# Altium schematic symbol library Electronic Devices_LIB.SchLib: 703 symbols (part 3 of 8) (continued)
## IC_CMOS_SENSOR_OV10642-N79Y-PF (continued)

## IC_CMOS_SENSOR_OX08B40
designator U?, comment OX08B40
1/1.73" color CMOS 8 MP (3840X2160) hight dynamic range (HDR) high definition (HD) image sensor; Manufacturer: OmniVision Technologies; Supplier 1: Digikey; Manufacturer Part Number: OX08B40; RoHS: No; Supplier Part Number 1: 884-OX08B40-EXAL-AA1B-ND
footprint CMOS_SENSOR_OX08B40_BGA88C90P11X8_1100X800X137 (BGA, 88-Leads, Body 11.00x8.00mmx1.37mm, Pitch 0.90mm)
pins: A1 NC1, A2 DVDD, A3 DVDD, A4 AVDD, A5 AVDD, A6 AVDD, A7 AVDD, A8 AVDD, A9 VH2, A10 DVDD, A11 NC3, B1 DGND, B2 DGND, B3 DGND, B4 AGND, B5 AGND, B6 AGND, B7 AGND, B8 AGND, B9 VH1, B10 DGND, B11 DVDD, C1 MDN2, C2 MDP2, C3 DGND, C4 DVDD, C5 VMERRB, C6 GPIO5, C7 SCL, C8 SDA, C9 TM, C10 DGND, C11 DVDD, D1 MDN0, D2 MDP0, D3 DGND, D4 DVDD, D5 DVDD, D6 GPIO6, D7 GPIO2, D8 SID, D9 RESETB, D10 DGND, D11 DVDD, E1 MCN, E2 MCP, E3 DGND, E6 XVCLK, E7 GPIO1, E8 GPIO4, E9 ATEST, E10 DGND, E11 DVDD, F1 MDN1, F2 MDP1, F3 DGND, F4 DOVDD, F5 VSYNC, F6 ERRB, F7 GPIO0, F8 GPIO3, F9 DOVDD, F10 DGND, F11 DVDD, G1 MDN3, G2 MDP3, G3 DGND, G4 FSIN, G5 AGND, G6 AGND, G8 AGND, G9 AGND, G10 VN2, G11 DVDD, H1 NC2, H2 DGND, H3 DVDD, H4 DVDD, H5 AVDD, H6 AVDD, H7 AVDD, H8 AVDD, H9 AVDD, H10 VN1, H11 NC4

## IC_COMPARATOR_CMOS_1_RS8907XF
designator U?, comment RS8907XF
IC Comp Rrio 1.4V P-p SOT23-5; Manufacturer: RUNIC Technology; Supplier 1: Digikey; Manufacturer Part Number: RS8907XF; RoHS: No; Stock 1: 2177; Pricing 1: 1=0.6, 10=0.511, 25=0.4772, 100=0.3818, 250=0.35452, 500=0.29996, 1000=0.2318 (USD); Supplier Part Number 1: 3565-RS8907XFCT-ND
footprint SOT-23-5
pins: 1 +IN (in), 2 V- (power), 3 -IN (in), 4 OUT (out), 5 V+ (power)

## IC_CURRENT_SENSOR_ACS71240KEXBLT-010B3
designator U?, comment ACS71240KEXBLT-010B3
Closed Loop/Open Loop Current Sensor AC/DC Current 3.3V Automotive 12-Pin QFN EP T/R; Manufacturer: Allegro MicroSystems; Supplier 1: Digi-Key; Manufacturer Part Number: ACS71240KEXBLT-010B3; RoHS: Yes; Category: Current Sensors; Stock 1: 9615; Pricing 1: 1=2.09, 10=1.614, 25=1.3452, 50=1.3154, 100=1.1958, 500=1.04636 (USD); Supplier Part Number 1: 620-2048-1-ND
pins: 1 IP+, 3 IP-, 5 GND, 6 ~{FAULT}, 7 NC_1, 8 NC_2, 9 NC_3, 10 NC_4, 11 VIOUT, 12 VCC

## IC_DAC_10BIT_AD5821ABCBZ-REEL7
designator U?, comment AD5821ABCBZ-REEL7
DAC 1-CH 10-bit 9-Pin WLCSP T/R; Manufacturer: Analog Devices; Max Power Dissipation: 5mW; Number of Channels: 1; Interface: I2C,Serial,2-Wire; Max Supply Voltage: 5.5V; Min Supply Voltage: 2.7V; Number of Bits: 10; Settling Time: 250us; Differential Output: No; Resolution: 10b; Integral Nonlinearity (INL): 4LSB; Sampling Rate: 20KS/s; Output Polarity: Unipolar; Supplier 1: Digikey; Manufacturer Part Number: AD5821ABCBZ-REEL7; RoHS: Yes; Category: Digital to Analog Converters (DACs); Stock 1: 2098; Pricing 1: 1=2.83, 10=2.543, 25=2.3988, 100=2.0437, 250=1.919, 500=1.67912, 1000=1.39128 (USD); Case/Package: 120; Number of Pins: 9; Contact Plating: Copper,Tin,Silver; Min Operating Temperature: -25°C; Max Operating Temperature: 85°C; Package Quantity: 3000; Number of DAC Channels: 1; Packaging: Tape and Reel; Number of D/A Converters: 1; Number of Converters: 1; Power Dissipation: 5mW; Series: -; Lead Free: Contains Lead; RoHS Compliant: Yes; ComponentLink1URL: https://datasheet.ciiva.com/6673/ad5821a-6673472.pdf?src-supplier=Digikey; ComponentLink1Description: https://datasheet.ciiva.com/6673/ad5821a-6673472.pdf?src-supplier=Digikey; ComponentLink2URL: https://datasheet.ciiva.com/6673/ad5821a-6673471.pdf?src-supplier=Digikey; ComponentLink2Description: https://datasheet.ciiva.com/6673/ad5821a-6673471.pdf?src-supplier=Digikey; ComponentLink3URL: https://datasheet.ciiva.com/8192/ad5821a-8192070.pdf?src-supplier=Avnet; ComponentLink3Description: https://datasheet.ciiva.com/8192/ad5821a-8192070.pdf?src-supplier=Avnet; ComponentLink4URL: https://datasheet.ciiva.com/48705/001246786-da-01-en-ic-dac-10b-ad5821abcbz-reel7-wlcsp-9-adi-48705206.pdf?src-supplier=Conrad; ComponentLink4Description: https://datasheet.ciiva.com/48705/001246786-da-01-en-ic-dac-10b-ad5821abcbz-reel7-wlcsp-9-adi-48705206.pdf?src-supplier=Conrad; Supplier Part Number 1: 505-AD5821ABCBZ-REEL7CT-ND
footprint IC_DAC_BGA9C50P3X3_152X169X65
pins: A1 ISINK, A2 NC, A3 XSHUTDOWN, B1 AGND, B2 DGND_1, B3 SDA, C1 DGND_2, C2 VDD, C3 SCL

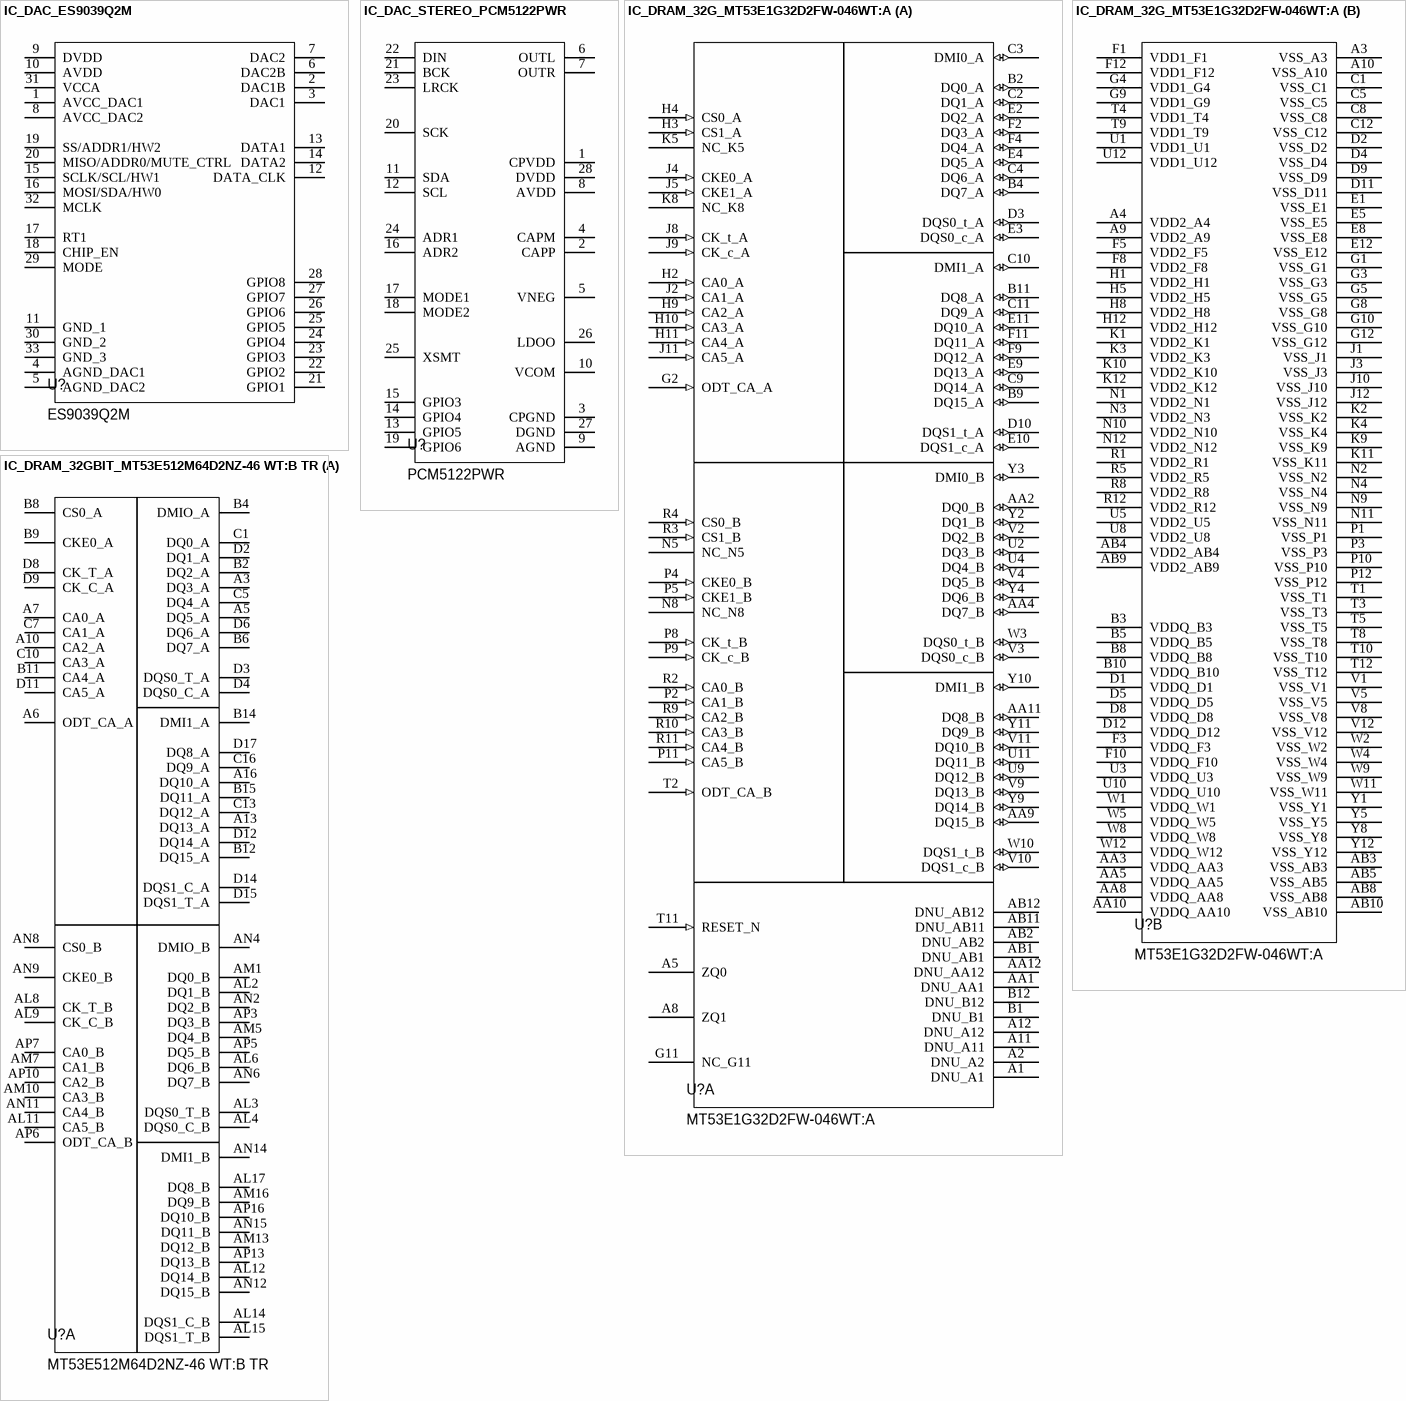
[diagram p9: symbols IC_DAC_ES9039Q2M to IC_DRAM_32GBIT_MT53E512M64D2NZ-46 WT:B TR]

## IC_DAC_ES9039Q2M
designator U?, comment ES9039Q2M
Digital to Analog Converters - DAC Sabre 32 Reference Stereo low power audiophile DAC w/DOP, TDM; Manufacturer: ESS Technology; Supplier 1: Mouser; Manufacturer Part Number: ES9039Q2M; RoHS: No; Category: Uncategorized; Stock 1: 726; Pricing 1: 1=17, 5=14.67, 10=14.67, 25=13.6, 50=13.6, 100=12.75, 1000=12.75, 10000=12.75 (USD); Supplier Part Number 1: 460-ES9039Q2M
footprint IC_DAC_QFN50P500X500X90-33N-D (32 QFN)
pins: 1 AVCC_DAC1, 2 DAC1B, 3 DAC1, 4 AGND_DAC1, 5 AGND_DAC2, 6 DAC2B, 7 DAC2, 8 AVCC_DAC2, 9 DVDD, 10 AVDD, 11 GND_1, 12 DATA_CLK, 13 DATA1, 14 DATA2, 15 SCLK/SCL/HW1, 16 MOSI/SDA/HW0, 17 RT1, 18 CHIP_EN, 19 SS/ADDR1/HW2, 20 MISO/ADDR0/MUTE_CTRL, 21 GPIO1, 22 GPIO2, 23 GPIO3, 24 GPIO4, 25 GPIO5, 26 GPIO6, 27 GPIO7, 28 GPIO8, 29 MODE, 30 GND_2, 31 VCCA, 32 MCLK, 33 GND_3

## IC_DAC_STEREO_PCM5122PWR
designator U?, comment PCM5122PWR
2V RMS DIRECTPATH 112dB Audio Stereo DAC with PCM Interface and Fixed Audio Processing 28-TSSOP -25 to 85; Manufacturer: Texas Instruments; Number of Channels: 2; Operating Supply Voltage: 3.3V; Interface: I2S; Output Voltage: 2.1V; Sampling Rate: 384000S/s; Resolution: 32b; Supply Type: Analog,Digital; Conversion Rate: 384KS/s; Number of Analog Inputs: 0; Output Type: Voltage; Supply Current: 15mA; Supplier 1: Digikey; Manufacturer Part Number: PCM5122PWR; RoHS: Yes; Category: Amplifiers - Audio; Stock 1: 1614; Pricing 1: 1=4.33, 10=3.283, 25=3.0216, 100=2.7335, 250=2.59624, 500=2.51348, 1000=2.44534, 2000=1.39517, 4000=1.36545, 6000=1.35056 (USD); Mount: Surface Mount; Case/Package: TSSOP; Number of Pins: 28; Min Operating Temperature: -25°C; Max Operating Temperature: 85°C; Packaging: Tape and Reel; Package Quantity: 2000; Number of D/A Converters: 2; Signal to Noise Ratio (SNR): 112dB; Number of DAC Channels: 2; Number of Analog Outputs: 2; Series: DirectPath™; Lead Free: Lead Free; RoHS Compliant: Yes; ComponentLink1URL: https://datasheet.ciiva.com/41460/001186187-da-01-en-ic-dac-16-24-32b-pcm5122pwr-tssop-28-tid-41460125.pdf?src-supplier=Conrad; ComponentLink1Description: https://datasheet.ciiva.com/41460/001186187-da-01-en-ic-dac-16-24-32b-pcm5122pwr-tssop-28-tid-41460125.pdf?src-supplier=Conrad; ComponentLink2URL: https://datasheet.ciiva.com/6671/pcm5122-6671229.pdf?src-supplier=Digikey; ComponentLink2Description: https://datasheet.ciiva.com/6671/pcm5122-6671229.pdf?src-supplier=Digikey; ComponentLink3URL: https://datasheet.ciiva.com/6671/pcm5122-6671230.pdf?src-supplier=Digikey; ComponentLink3Description: https://datasheet.ciiva.com/6671/pcm5122-6671230.pdf?src-supplier=Digikey; ComponentLink4URL: https://datasheet.ciiva.com/6671/pcm5122-6671231.pdf?src-supplier=Digikey; ComponentLink4Description: https://datasheet.ciiva.com/6671/pcm5122-6671231.pdf?src-supplier=Digikey; Supplier Part Number 1: 296-35527-1-ND
footprint IC_DAC_SOP65P640X120-28N
pins: 1 CPVDD, 2 CAPP, 3 CPGND, 4 CAPM, 5 VNEG, 6 OUTL, 7 OUTR, 8 AVDD, 9 AGND, 10 VCOM, 11 SDA, 12 SCL, 13 GPIO5, 14 GPIO4, 15 GPIO3, 16 ADR2, 17 MODE1, 18 MODE2, 19 GPIO6, 20 SCK, 21 BCK, 22 DIN, 23 LRCK, 24 ADR1, 25 XSMT, 26 LDOO, 27 DGND, 28 DVDD

## IC_DRAM_32G_MT53E1G32D2FW-046WT:A
designator U?, comment MT53E1G32D2FW-046WT:A
LPDDR4 32G 1GX32 FBGA DDP; Manufacturer: Micron Technology; Supplier 1: Digikey; Manufacturer Part Number: MT53E1G32D2FW-046WT:A; RoHS: No; Stock 1: 1349; Pricing 1: 1=26.73, 10=24.892, 25=24.6252, 50=24.0178, 100=21.0842, 250=20.37296, 500=19.82474 (USD); Supplier Part Number 1: 557-MT53E1G32D2FW-046WT:A-ND
footprint IC_DRAM_BGA200_0P65X0P8_10P1X14P6 (200-TFBGA (10x14.5))
part A pins: A1 DNU_A1, A2 DNU_A2, A5 ZQ0, A8 ZQ1, A11 DNU_A11, A12 DNU_A12, AA1 DNU_AA1, AA2 DQ0_B (io), AA4 DQ7_B (io), AA9 DQ15_B (io), AA11 DQ8_B (io), AA12 DNU_AA12, AB1 DNU_AB1, AB2 DNU_AB2, AB11 DNU_AB11, AB12 DNU_AB12, B1 DNU_B1, B2 DQ0_A (io), B4 DQ7_A (io), B9 DQ15_A (io), B11 DQ8_A (io), B12 DNU_B12, C2 DQ1_A (io), C3 DMI0_A (io), C4 DQ6_A (io), C9 DQ14_A (io), C10 DMI1_A (io), C11 DQ9_A (io), D3 DQS0_t_A (io), D10 DQS1_t_A (io), E2 DQ2_A (io), E3 DQS0_c_A (io), E4 DQ5_A (io), E9 DQ13_A (io), E10 DQS1_c_A (io), E11 DQ10_A (io), F2 DQ3_A (io), F4 DQ4_A (io), F9 DQ12_A (io), F11 DQ11_A (io), G2 ODT_CA_A (in), G11 NC_G11, H2 CA0_A (in), H3 CS1_A (in), H4 CS0_A (in), H9 CA2_A (in), H10 CA3_A (in), H11 CA4_A (in), J2 CA1_A (in), J4 CKE0_A (in), J5 CKE1_A (in), J8 CK_t_A (in), J9 CK_c_A (in), J11 CA5_A (in), K5 NC_K5, K8 NC_K8, N5 NC_N5, N8 NC_N8, P2 CA1_B (in), P4 CKE0_B (in), P5 CKE1_B (in), P8 CK_t_B (in), P9 CK_c_B (in), P11 CA5_B (in), R2 CA0_B (in), R3 CS1_B (in), R4 CS0_B (in), R9 CA2_B (in), R10 CA3_B (in), R11 CA4_B (in), T2 ODT_CA_B (in), T11 RESET_N (in), U2 DQ3_B (io), U4 DQ4_B (io), U9 DQ12_B (io), U11 DQ11_B (io), V2 DQ2_B (io), V3 DQS0_c_B (io), V4 DQ5_B (io), V9 DQ13_B (io), V10 DQS1_c_B (io), V11 DQ10_B (io), W3 DQS0_t_B (io), W10 DQS1_t_B (io), Y2 DQ1_B (io), Y3 DMI0_B (io), Y4 DQ6_B (io), Y9 DQ14_B (io), Y10 DMI1_B (io), Y11 DQ9_B (io)
part B pins: A3 VSS_A3 (power), A4 VDD2_A4 (power), A9 VDD2_A9 (power), A10 VSS_A10 (power), AA3 VDDQ_AA3 (power), AA5 VDDQ_AA5 (power), AA8 VDDQ_AA8 (power), AA10 VDDQ_AA10 (power), AB3 VSS_AB3 (power), AB4 VDD2_AB4 (power), AB5 VSS_AB5 (power), AB8 VSS_AB8 (power), AB9 VDD2_AB9 (power), AB10 VSS_AB10 (power), B3 VDDQ_B3 (power), B5 VDDQ_B5 (power), B8 VDDQ_B8 (power), B10 VDDQ_B10 (power), C1 VSS_C1 (power), C5 VSS_C5 (power), C8 VSS_C8 (power), C12 VSS_C12 (power), D1 VDDQ_D1 (power), D2 VSS_D2 (power), D4 VSS_D4 (power), D5 VDDQ_D5 (power), D8 VDDQ_D8 (power), D9 VSS_D9 (power), D11 VSS_D11 (power), D12 VDDQ_D12 (power), E1 VSS_E1 (power), E5 VSS_E5 (power), E8 VSS_E8 (power), E12 VSS_E12 (power), F1 VDD1_F1 (power), F3 VDDQ_F3 (power), F5 VDD2_F5 (power), F8 VDD2_F8 (power), F10 VDDQ_F10 (power), F12 VDD1_F12 (power), G1 VSS_G1 (power), G3 VSS_G3 (power), G4 VDD1_G4 (power), G5 VSS_G5 (power), G8 VSS_G8 (power), G9 VDD1_G9 (power), G10 VSS_G10 (power), G12 VSS_G12 (power), H1 VDD2_H1 (power), H5 VDD2_H5 (power), H8 VDD2_H8 (power), H12 VDD2_H12 (power), J1 VSS_J1 (power), J3 VSS_J3 (power), J10 VSS_J10 (power), J12 VSS_J12 (power), K1 VDD2_K1 (power), K2 VSS_K2 (power), K3 VDD2_K3 (power), K4 VSS_K4 (power), K9 VSS_K9 (power), K10 VDD2_K10 (power), K11 VSS_K11 (power), K12 VDD2_K12 (power), N1 VDD2_N1 (power), N2 VSS_N2 (power), N3 VDD2_N3 (power), N4 VSS_N4 (power), N9 VSS_N9 (power), N10 VDD2_N10 (power), N11 VSS_N11 (power), N12 VDD2_N12 (power), P1 VSS_P1 (power), P3 VSS_P3 (power), P10 VSS_P10 (power), P12 VSS_P12 (power), R1 VDD2_R1 (power), R5 VDD2_R5 (power), R8 VDD2_R8 (power), R12 VDD2_R12 (power), T1 VSS_T1 (power), T3 VSS_T3 (power), T4 VDD1_T4 (power), T5 VSS_T5 (power), T8 VSS_T8 (power), T9 VDD1_T9 (power), T10 VSS_T10 (power), T12 VSS_T12 (power), U1 VDD1_U1 (power), U3 VDDQ_U3 (power), U5 VDD2_U5 (power), U8 VDD2_U8 (power), U10 VDDQ_U10 (power), U12 VDD1_U12 (power), V1 VSS_V1 (power), V5 VSS_V5 (power), V8 VSS_V8 (power), V12 VSS_V12 (power), W1 VDDQ_W1 (power), W2 VSS_W2 (power), W4 VSS_W4 (power), W5 VDDQ_W5 (power), W8 VDDQ_W8 (power), W9 VSS_W9 (power), W11 VSS_W11 (power), W12 VDDQ_W12 (power), Y1 VSS_Y1 (power), Y5 VSS_Y5 (power), Y8 VSS_Y8 (power), Y12 VSS_Y12 (power)

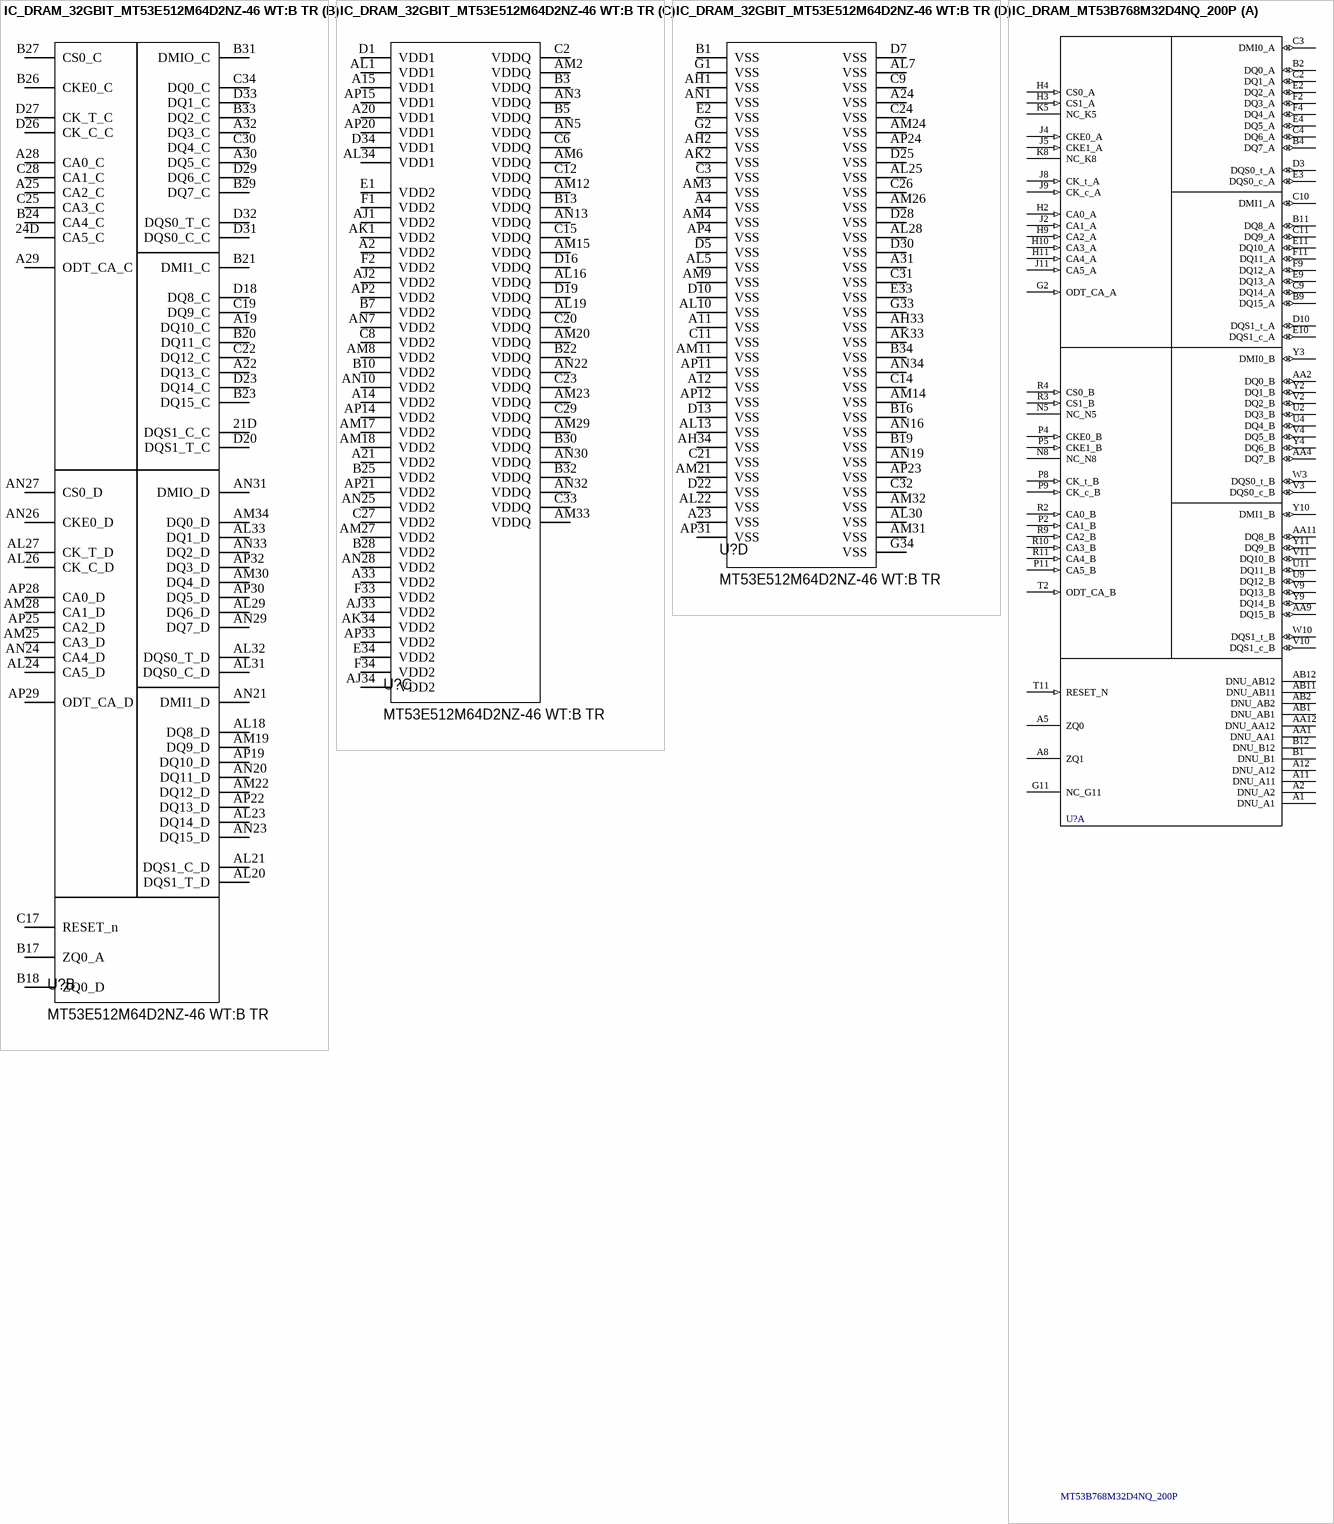
[diagram p10: symbols IC_DRAM_32GBIT_MT53E512M64D2NZ-46 WT:B TR to IC_DRAM_MT53B768M32D4NQ_200P]

## IC_DRAM_32GBIT_MT53E512M64D2NZ-46 WT:B TR
designator U?, comment MT53E512M64D2NZ-46 WT:B TR
IC Dram 32GBIT Par 376WFBGA; Manufacturer: Micron; Supplier 1: DigiKey; Manufacturer Part Number: MT53E512M64D2NZ-46 WT:B TR; Pricing 1: 2000=21.7625 (USD); Supplier Part Number 1: 557-MT53E512M64D2NZ-46WT:BTR-ND
footprint IC_DRAM_BGA376C40P34X34_1400X1400X71 (BGA, 376-Leads, Body 14.00x14.00mmx0.71mm, Pitch 0.40mm)
part A pins: A3 DQ3_A, A5 DQ5_A, A6 ODT_CA_A, A7 CA0_A, A10 CA2_A, A13 DQ13_A, A16 DQ10_A, AL2 DQ1_B, AL3 DQS0_T_B, AL4 DQS0_C_B, AL6 DQ6_B, AL8 CK_T_B, AL9 CK_C_B, AL11 CA5_B, AL12 DQ14_B, AL14 DQS1_C_B, AL15 DQS1_T_B, AL17 DQ8_B, AM1 DQ0_B, AM5 DQ4_B, AM7 CA1_B, AM10 CA3_B, AM13 DQ12_B, AM16 DQ9_B, AN2 DQ2_B, AN4 DMIO_B, AN6 DQ7_B, AN8 CS0_B, AN9 CKE0_B, AN11 CA4_B, AN12 DQ15_B, AN14 DMI1_B, AN15 DQ11_B, AP3 DQ3_B, AP5 DQ5_B, AP6 ODT_CA_B, AP7 CA0_B, AP10 CA2_B, AP13 DQ13_B, AP16 DQ10_B, B2 DQ2_A, B4 DMIO_A, B6 DQ7_A, B8 CS0_A, B9 CKE0_A, B11 CA4_A, B12 DQ15_A, B14 DMI1_A, B15 DQ11_A, C1 DQ0_A, C5 DQ4_A, C7 CA1_A, C10 CA3_A, C13 DQ12_A, C16 DQ9_A, D2 DQ1_A, D3 DQS0_T_A, D4 DQS0_C_A, D6 DQ6_A, D8 CK_T_A, D9 CK_C_A, D11 CA5_A, D12 DQ14_A, D14 DQS1_C_A, D15 DQS1_T_A, D17 DQ8_A
part B pins: 21D DQS1_C_C, 24D CA5_C, A19 DQ10_C, A22 DQ13_C, A25 CA2_C, A28 CA0_C, A29 ODT_CA_C, A30 DQ5_C, A32 DQ3_C, AL18 DQ8_D, AL20 DQS1_T_D, AL21 DQS1_C_D, AL23 DQ14_D, AL24 CA5_D, AL26 CK_C_D, AL27 CK_T_D, AL29 DQ6_D, AL31 DQS0_C_D, AL32 DQS0_T_D, AL33 DQ1_D, AM19 DQ9_D, AM22 DQ12_D, AM25 CA3_D, AM28 CA1_D, AM30 DQ4_D, AM34 DQ0_D, AN20 DQ11_D, AN21 DMI1_D, AN23 DQ15_D, AN24 CA4_D, AN26 CKE0_D, AN27 CS0_D, AN29 DQ7_D, AN31 DMIO_D, AN33 DQ2_D, AP19 DQ10_D, AP22 DQ13_D, AP25 CA2_D, AP28 CA0_D, AP29 ODT_CA_D, AP30 DQ5_D, AP32 DQ3_D, B17 ZQ0_A, B18 ZQ0_D, B20 DQ11_C, B21 DMI1_C, B23 DQ15_C, B24 CA4_C, B26 CKE0_C, B27 CS0_C, B29 DQ7_C, B31 DMIO_C, B33 DQ2_C, C17 RESET_n, C19 DQ9_C, C22 DQ12_C, C25 CA3_C, C28 CA1_C, C30 DQ4_C, C34 DQ0_C, D18 DQ8_C, D20 DQS1_T_C, D23 DQ14_C, D26 CK_C_C, D27 CK_T_C, D29 DQ6_C, D31 DQS0_C_C, D32 DQS0_T_C, D33 DQ1_C
part C pins: A2 VDD2, A14 VDD2, A15 VDD1, A20 VDD1, A21 VDD2, A33 VDD2, AJ1 VDD2, AJ2 VDD2, AJ33 VDD2, AJ34 VDD2, AK1 VDD2, AK34 VDD2, AL1 VDD1, AL16 VDDQ, AL19 VDDQ, AL34 VDD1, AM2 VDDQ, AM6 VDDQ, AM8 VDD2, AM12 VDDQ, AM15 VDDQ, AM17 VDD2, AM18 VDD2, AM20 VDDQ, AM23 VDDQ, AM27 VDD2, AM29 VDDQ, AM33 VDDQ, AN3 VDDQ, AN5 VDDQ, AN7 VDD2, AN10 VDD2, AN13 VDDQ, AN22 VDDQ, AN25 VDD2, AN28 VDD2, AN30 VDDQ, AN32 VDDQ, AP2 VDD2, AP14 VDD2, AP15 VDD1, AP20 VDD1, AP21 VDD2, AP33 VDD2, B3 VDDQ, B5 VDDQ, B7 VDD2, B10 VDD2, B13 VDDQ, B22 VDDQ, B25 VDD2, B28 VDD2, B30 VDDQ, B32 VDDQ, C2 VDDQ, C6 VDDQ, C8 VDD2, C12 VDDQ, C15 VDDQ, C20 VDDQ, C23 VDDQ, C27 VDD2, C29 VDDQ, C33 VDDQ, D1 VDD1, D16 VDDQ, D19 VDDQ, D34 VDD1, E1 VDD2, E34 VDD2, F1 VDD2, F2 VDD2, F33 VDD2, F34 VDD2
part D pins: A4 VSS, A11 VSS, A12 VSS, A23 VSS, A24 VSS, A31 VSS, AH1 VSS, AH2 VSS, AH33 VSS, AH34 VSS, AK2 VSS, AK33 VSS, AL5 VSS, AL7 VSS, AL10 VSS, AL13 VSS, AL22 VSS, AL25 VSS, AL28 VSS, AL30 VSS, AM3 VSS, AM4 VSS, AM9 VSS, AM11 VSS, AM14 VSS, AM21 VSS, AM24 VSS, AM26 VSS, AM31 VSS, AM32 VSS, AN1 VSS, AN16 VSS, AN19 VSS, AN34 VSS, AP4 VSS, AP11 VSS, AP12 VSS, AP23 VSS, AP24 VSS, AP31 VSS, B1 VSS, B16 VSS, B19 VSS, B34 VSS, C3 VSS, C9 VSS, C11 VSS, C14 VSS, C21 VSS, C24 VSS, C26 VSS, C31 VSS, C32 VSS, D5 VSS, D7 VSS, D10 VSS, D13 VSS, D22 VSS, D25 VSS, D28 VSS, D30 VSS, E2 VSS, E33 VSS, G1 VSS, G2 VSS, G33 VSS, G34 VSS

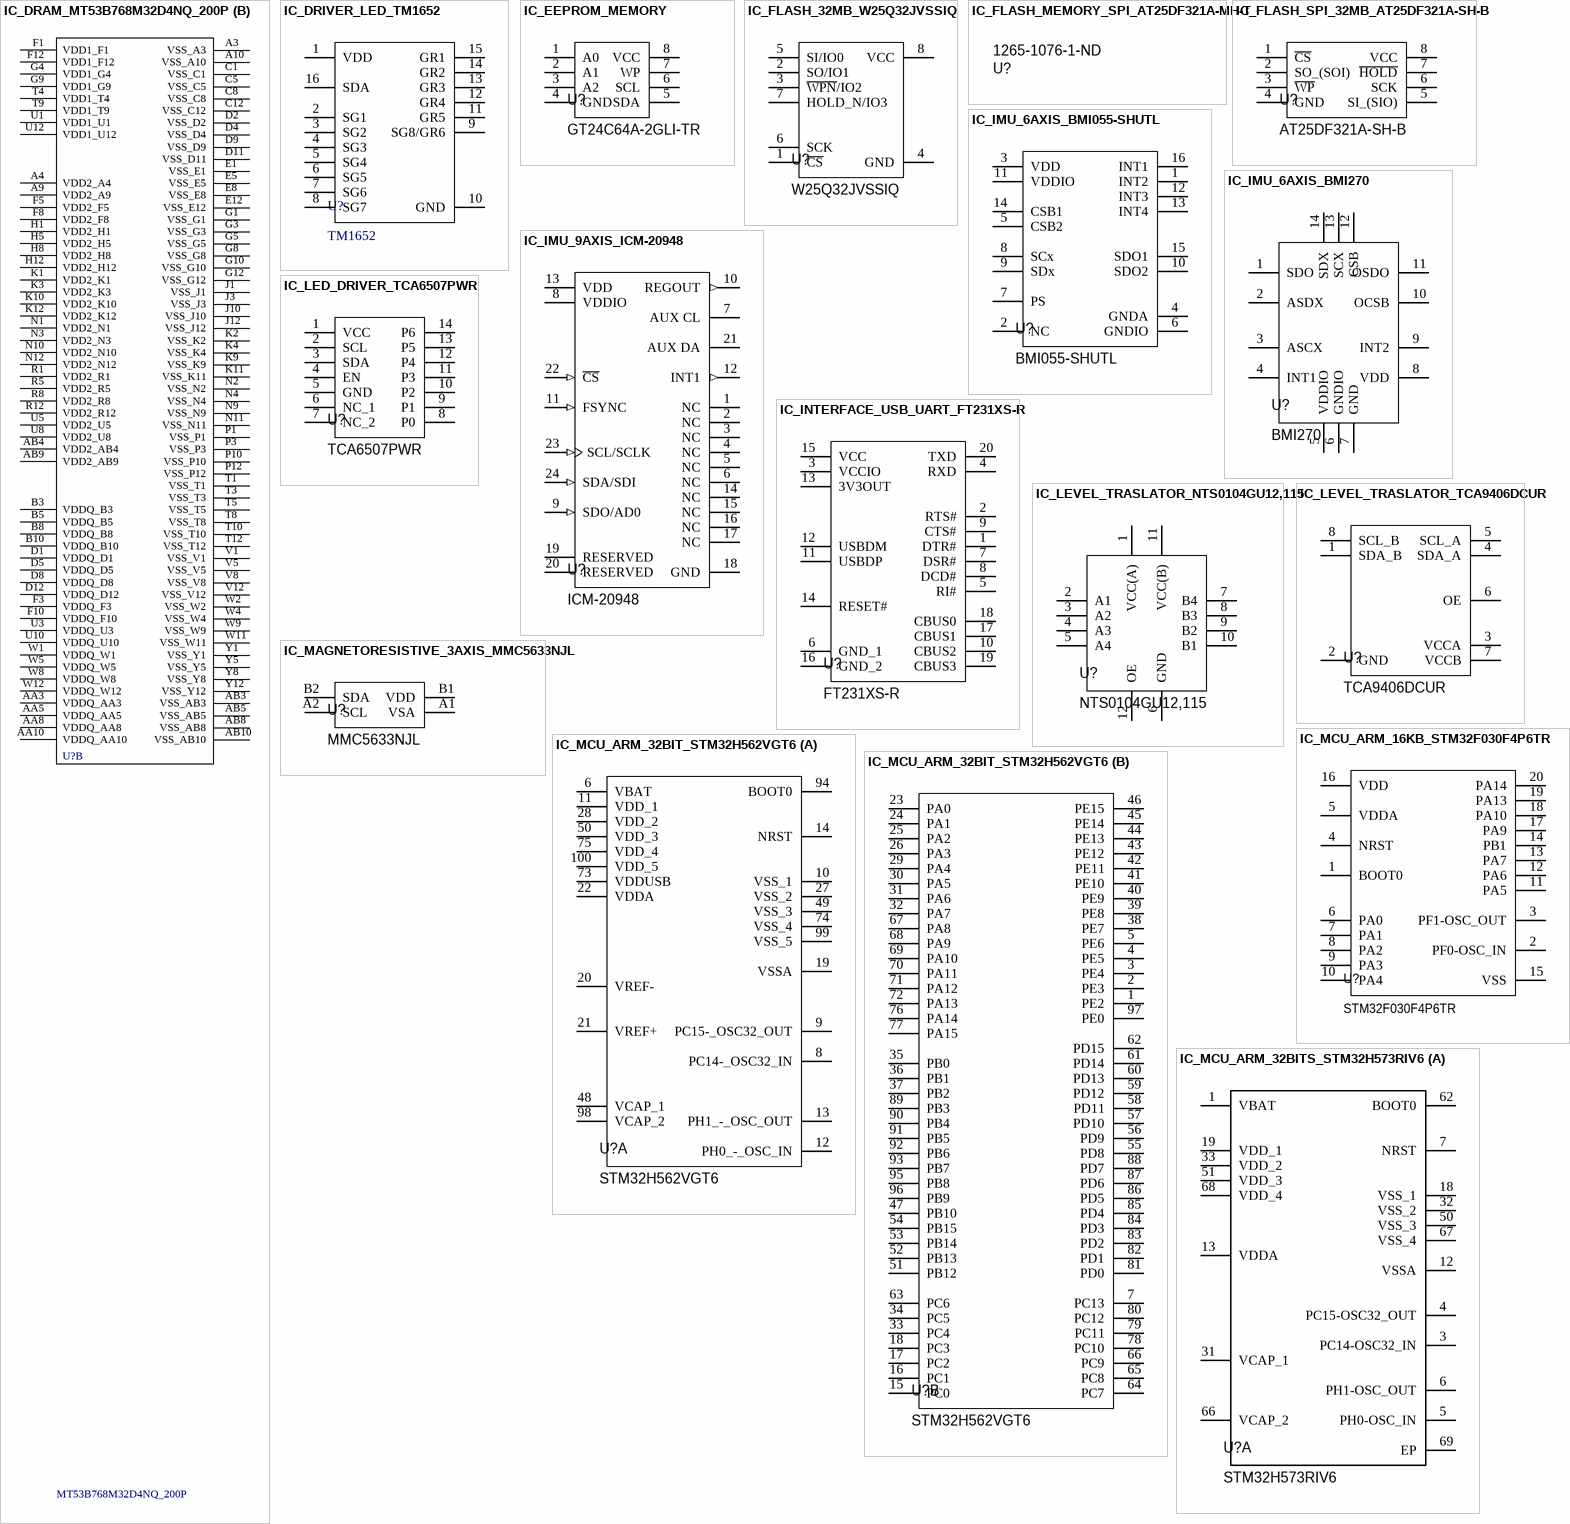
[diagram p11: symbols IC_DRAM_MT53B768M32D4NQ_200P to IC_MCU_ARM_32BITS_STM32H573RIV6]

## IC_DRAM_MT53B768M32D4NQ_200P
designator U?, comment MT53B768M32D4NQ_200P
IC MEM LPDDR4 LPDDR4X SDRAM 1536 Meg x 32 1.1V VFBGA200; Manufacturer: Microm; SWAP_INFO: (S1+S2); SPLIT_INST: TRUE; CLASS: IC; Manufacturer Part Number: MT53B768M32D4NQ_200P
footprint IC_DRAM_MT53E1536M32D4DT-046 WT:A (BGA200_0P65X0P8_10P1X14P6)
part A pins: A1 DNU_A1, A2 DNU_A2, A5 ZQ0, A8 ZQ1, A11 DNU_A11, A12 DNU_A12, AA1 DNU_AA1, AA2 DQ0_B (io), AA4 DQ7_B (io), AA9 DQ15_B (io), AA11 DQ8_B (io), AA12 DNU_AA12, AB1 DNU_AB1, AB2 DNU_AB2, AB11 DNU_AB11, AB12 DNU_AB12, B1 DNU_B1, B2 DQ0_A (io), B4 DQ7_A (io), B9 DQ15_A (io), B11 DQ8_A (io), B12 DNU_B12, C2 DQ1_A (io), C3 DMI0_A (io), C4 DQ6_A (io), C9 DQ14_A (io), C10 DMI1_A (io), C11 DQ9_A (io), D3 DQS0_t_A (io), D10 DQS1_t_A (io), E2 DQ2_A (io), E3 DQS0_c_A (io), E4 DQ5_A (io), E9 DQ13_A (io), E10 DQS1_c_A (io), E11 DQ10_A (io), F2 DQ3_A (io), F4 DQ4_A (io), F9 DQ12_A (io), F11 DQ11_A (io), G2 ODT_CA_A (in), G11 NC_G11, H2 CA0_A (in), H3 CS1_A (in), H4 CS0_A (in), H9 CA2_A (in), H10 CA3_A (in), H11 CA4_A (in), J2 CA1_A (in), J4 CKE0_A (in), J5 CKE1_A (in), J8 CK_t_A (in), J9 CK_c_A (in), J11 CA5_A (in), K5 NC_K5, K8 NC_K8, N5 NC_N5, N8 NC_N8, P2 CA1_B (in), P4 CKE0_B (in), P5 CKE1_B (in), P8 CK_t_B (in), P9 CK_c_B (in), P11 CA5_B (in), R2 CA0_B (in), R3 CS1_B (in), R4 CS0_B (in), R9 CA2_B (in), R10 CA3_B (in), R11 CA4_B (in), T2 ODT_CA_B (in), T11 RESET_N (in), U2 DQ3_B (io), U4 DQ4_B (io), U9 DQ12_B (io), U11 DQ11_B (io), V2 DQ2_B (io), V3 DQS0_c_B (io), V4 DQ5_B (io), V9 DQ13_B (io), V10 DQS1_c_B (io), V11 DQ10_B (io), W3 DQS0_t_B (io), W10 DQS1_t_B (io), Y2 DQ1_B (io), Y3 DMI0_B (io), Y4 DQ6_B (io), Y9 DQ14_B (io), Y10 DMI1_B (io), Y11 DQ9_B (io)
part B pins: A3 VSS_A3 (power), A4 VDD2_A4 (power), A9 VDD2_A9 (power), A10 VSS_A10 (power), AA3 VDDQ_AA3 (power), AA5 VDDQ_AA5 (power), AA8 VDDQ_AA8 (power), AA10 VDDQ_AA10 (power), AB3 VSS_AB3 (power), AB4 VDD2_AB4 (power), AB5 VSS_AB5 (power), AB8 VSS_AB8 (power), AB9 VDD2_AB9 (power), AB10 VSS_AB10 (power), B3 VDDQ_B3 (power), B5 VDDQ_B5 (power), B8 VDDQ_B8 (power), B10 VDDQ_B10 (power), C1 VSS_C1 (power), C5 VSS_C5 (power), C8 VSS_C8 (power), C12 VSS_C12 (power), D1 VDDQ_D1 (power), D2 VSS_D2 (power), D4 VSS_D4 (power), D5 VDDQ_D5 (power), D8 VDDQ_D8 (power), D9 VSS_D9 (power), D11 VSS_D11 (power), D12 VDDQ_D12 (power), E1 VSS_E1 (power), E5 VSS_E5 (power), E8 VSS_E8 (power), E12 VSS_E12 (power), F1 VDD1_F1 (power), F3 VDDQ_F3 (power), F5 VDD2_F5 (power), F8 VDD2_F8 (power), F10 VDDQ_F10 (power), F12 VDD1_F12 (power), G1 VSS_G1 (power), G3 VSS_G3 (power), G4 VDD1_G4 (power), G5 VSS_G5 (power), G8 VSS_G8 (power), G9 VDD1_G9 (power), G10 VSS_G10 (power), G12 VSS_G12 (power), H1 VDD2_H1 (power), H5 VDD2_H5 (power), H8 VDD2_H8 (power), H12 VDD2_H12 (power), J1 VSS_J1 (power), J3 VSS_J3 (power), J10 VSS_J10 (power), J12 VSS_J12 (power), K1 VDD2_K1 (power), K2 VSS_K2 (power), K3 VDD2_K3 (power), K4 VSS_K4 (power), K9 VSS_K9 (power), K10 VDD2_K10 (power), K11 VSS_K11 (power), K12 VDD2_K12 (power), N1 VDD2_N1 (power), N2 VSS_N2 (power), N3 VDD2_N3 (power), N4 VSS_N4 (power), N9 VSS_N9 (power), N10 VDD2_N10 (power), N11 VSS_N11 (power), N12 VDD2_N12 (power), P1 VSS_P1 (power), P3 VSS_P3 (power), P10 VSS_P10 (power), P12 VSS_P12 (power), R1 VDD2_R1 (power), R5 VDD2_R5 (power), R8 VDD2_R8 (power), R12 VDD2_R12 (power), T1 VSS_T1 (power), T3 VSS_T3 (power), T4 VDD1_T4 (power), T5 VSS_T5 (power), T8 VSS_T8 (power), T9 VDD1_T9 (power), T10 VSS_T10 (power), T12 VSS_T12 (power), U1 VDD1_U1 (power), U3 VDDQ_U3 (power), U5 VDD2_U5 (power), U8 VDD2_U8 (power), U10 VDDQ_U10 (power), U12 VDD1_U12 (power), V1 VSS_V1 (power), V5 VSS_V5 (power), V8 VSS_V8 (power), V12 VSS_V12 (power), W1 VDDQ_W1 (power), W2 VSS_W2 (power), W4 VSS_W4 (power), W5 VDDQ_W5 (power), W8 VDDQ_W8 (power), W9 VSS_W9 (power), W11 VSS_W11 (power), W12 VDDQ_W12 (power), Y1 VSS_Y1 (power), Y5 VSS_Y5 (power), Y8 VSS_Y8 (power), Y12 VSS_Y12 (power)

## IC_DRIVER_LED_TM1652
designator U?, comment TM1652
TM(Shenzhen Titan Micro Elec) TM1652; Packcage: Soic-16; Supplier: LCSC; ComponentLink1Description: Link Supplier; ComponentLink1URL: *https://www.lcsc.com/product-detail/LED-Display-Drivers_TM-Shenzhen-Titan-Micro-Elec-TM1652_C52186.html
footprint IC_DRIVER_SOP127P600X175-16N (SOP, 16-Leads, Body 10.00x3.90mm, Pitch 1.27mm, IPC Medium Density)
pins: 1 VDD, 2 SG1, 3 SG2, 4 SG3, 5 SG4, 6 SG5, 7 SG6, 8 SG7, 9 SG8/GR6, 10 GND, 11 GR5, 12 GR4, 13 GR3, 14 GR2, 15 GR1, 16 SDA

## IC_EEPROM_MEMORY
designator U?, comment GT24C64A-2GLI-TR
SOIC-8 EEPROM ROHS; Manufacturer: Giantec; Manufacturer Part Number: GT24C64A-2GLI-TR; ComponentLink1Description: Supplier; ComponentLink1URL: https://jlcpcb.com/partdetail/Giantec-GT24C64A_2GLITR/C239142
footprint SOIC-8
pins: 1 A0, 2 A1, 3 A2, 4 GND, 5 SDA, 6 SCL, 7 WP, 8 VCC

## IC_FLASH_32MB_W25Q32JVSSIQ
designator U?, comment W25Q32JVSSIQ
NOR Flash Serial (SPI, Dual SPI, Quad SPI) 3V/3.3V 32M-bit 6ns 8-Pin SOIC T/R/Tray/Tube; Manufacturer: Winbond; Memory Type: Non-Volatile,FLASH,NOR; Frequency: 133MHz; Interface: SPI,Serial; Memory Size: 32Mb; Operating Supply Voltage: 3V; Page Size: 256B; Supplier 1: Digikey; Manufacturer Part Number: W25Q32JVSSIQ; RoHS: Yes; Category: Flash; Stock 1: 71931; Pricing 1: 1=0.8, 10=0.712, 25=0.6792, 90=0.63578, 180=0.61344, 270=0.6007, 540=0.57956, 1080=0.55913, 5040=0.51618 (USD); Mount: Surface Mount; Case/Package: SOIC; Number of Pins: 8; Min Operating Temperature: -40°C; Max Operating Temperature: 85°C; Packaging: Rail/Tube; Series: SpiFlash®; Density: 32Mb; Access Time: 6ns; Height: 2.16mm; RoHS Compliant: Yes; ComponentLink1URL: http://www.winbond.com/resource-files/w25q32jv%20revg%2003272018%20plus.pdf?src-supplier=Digikey; ComponentLink1Description: http://www.winbond.com/resource-files/w25q32jv%20revg%2003272018%20plus.pdf?src-supplier=Digikey; ComponentLink2URL: https://www.winbond.com/hq/product/code-storage-flash-memory/serial-nor-flash/?__locale=en&partNo=W25Q32JV&src-supplier=Avnet; ComponentLink2Description: https://www.winbond.com/hq/product/code-storage-flash-memory/serial-nor-flash/?__locale=en&partNo=W25Q32JV&src-supplier=Avnet; Supplier Part Number 1: W25Q32JVSSIQ-ND
footprint IC_FLASH_SOIC127P790X216-8N
pins: 1 ~{CS}, 2 SO/IO1, 3 ~{WPN}/IO2, 4 GND, 5 SI/IO0, 6 SCK, 7 HOLD_N/IO3, 8 VCC
